# Altium footprint library ZLS_Lib.PcbLib: 25 footprints (part 2 of 2)
Each footprint in its own frame and in the unit in brackets; x right, y up, seen from the top. Pads: shape width x height; smd on the part's side, far side on the other; paste and mask are expansions set on the pad; w line width, h text height; cw(c..) or ccw(c..) is an arc to the next point about the centre after c.
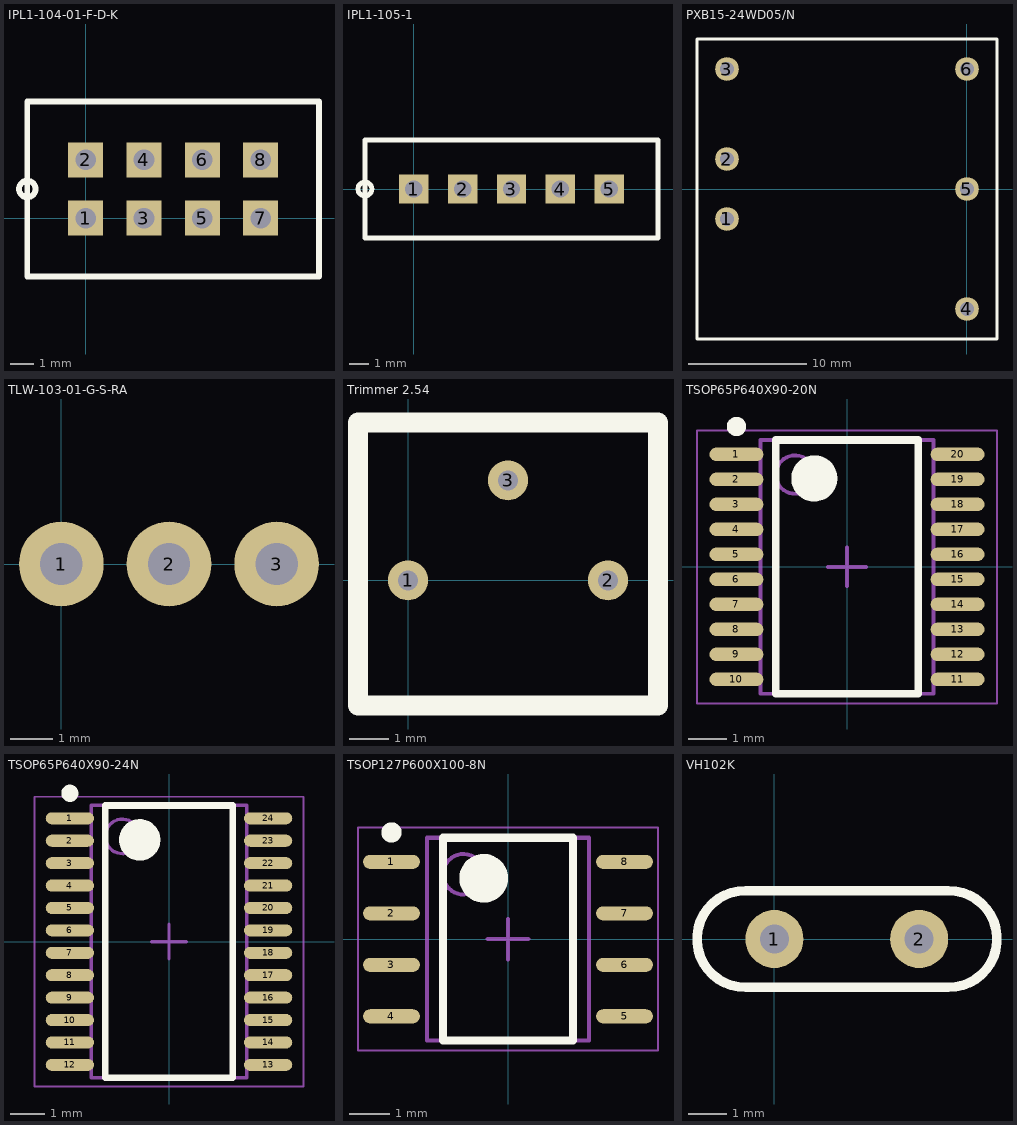
[diagram p1: the footprints below, top view; thin cyan lines are the x and y axes]

## IPL1-104-01-F-D-K [mil]
height 161
pads (8):
  rect 60x60 hole 35.43: 1(0,0) 2(0,100) 3(100,0) 4(100,100) 5(200,0) 6(200,100) 7(300,0) 8(300,100)
Top Overlay:
  circle w10: c-100,50 r14.14
  lines w10: -100,-100 400,-100 400,200 -100,200 -100,-100
3D body "_IPL1_104_01_D_header_2.sldprt": height 320, standoff 0, extent -80,-121 380,189

## IPL1-105-1 [mil]
height 344.88
pads (5):
  rect 60x60 hole 35.43: 1(0,0) 2(100,0) 3(200,0) 4(300,0) 5(400,0)
Top Overlay:
  circle w10: c-100,0 r14.14
  lines w10: -100,-100 -100,100 500,100 500,-100 -100,-100
3D body "_IPL1_105_01_S_header_2.sldprt": height 320, standoff 0, extent -81.18,-141.73 478.82,118.27

## PXB15-24WD05/N [mm] "DC-DC CONV 15W DUAL 5V"
height 9.9
pads (6):
  round 2 hole 1.2: 1(-20.32,-2.54) 2(-20.32,2.54) 3(-20.32,10.16) 4(0,-10.16) 5(0,0) 6(0,10.16)
Top Overlay:
  lines w0.254: -22.86,-12.7 -22.86,12.7 2.54,12.7 2.54,-12.7 -22.86,-12.7
3D body: height 9.9, standoff 0, extent -21.422,-11.262 1.102,11.262
3D body: height 9.9, standoff 0, extent -22.987,-12.827 2.667,12.827
3D body: height 9.9, standoff 0, extent -22.859,-12.699 2.539,12.699
3D body: height 9.9, standoff 0, extent -22.987,-12.827 2.667,12.827
3D body: height 9.9, standoff 0, extent -21.422,-11.262 1.102,11.262
3D body: height 9.9, standoff 0, extent -22.987,-12.827 2.667,12.827
3D body: height 9.9, standoff 0, extent -22.859,-12.699 2.539,12.699
3D body: height 9.9, standoff 0, extent -22.987,-12.827 2.667,12.827
3D body: height 9.9, standoff 0, extent -21.422,-11.262 1.102,11.262
3D body: height 9.9, standoff 0, extent -22.987,-12.827 2.667,12.827
3D body: height 9.9, standoff 0, extent -22.859,-12.699 2.539,12.699
3D body: height 9.9, standoff 0, extent -22.987,-12.827 2.667,12.827

## TLW-103-01-G-S-RA [mm]
height 1.52
pads (3):
  round 2 hole 1: 1(0,0) 2(2.54,0) 3(5.08,0)
3D body "_TLW_103_01_G_S_RA0_495_terminal_2.sldprt": height 1.52, standoff 0, extent -1.27,-1.245 6.35,1.245
3D body "_TLW_03_01_S_RA_4.sldprt": height 1.24, standoff -3.49, extent -0.381,-8.922 5.588,0.286

## Trimmer 2.54 [mil]
pads (3):
  round 40 hole 20: 1(0,0) 2(200,0) 3(100,100)
Top Overlay:
  lines w20: -50,-125 -50,157.6 -36.2,157.6 -20.6,157.6 39.4,157.6 250,157.6 250,-50 250,-125 -50,-125
3D body: height 175, standoff 0, extent -60,-125.98 260,167.6
3D body: height 175, standoff 0, extent -49.98,-122.05 249.98,157.58
3D body: height 175, standoff 0, extent -60,-119.09 260,167.6
3D body: height 175, standoff 0, extent -50.2,-125 248.03,157.6
3D body: height 175, standoff 100, extent -15.03,167.08 13.78,199.8

## TSOP65P640X90-20N [mm] "TSOP, 20-Leads, Body 6.50x4.40mm, Pitch 0.65mm, IPC Medium Density"
height 0.9
pads (20):
  oval 1.4x0.35 smd: 1(-2.875,2.925) 2(-2.875,2.275) 3(-2.875,1.625) 4(-2.875,0.975) 5(-2.875,0.325) 6(-2.875,-0.325) 7(-2.875,-0.975) 8(-2.875,-1.625) 9(-2.875,-2.275) 10(-2.875,-2.925) 11(2.875,-2.925) 12(2.875,-2.275) 13(2.875,-1.625) 14(2.875,-0.975) 15(2.875,-0.325) 16(2.875,0.325) 17(2.875,0.975) 18(2.875,1.625) 19(2.875,2.275) 20(2.875,2.925)
Top Overlay:
  circle w0.6: c-0.85,2.3 r0.3
  circle w0.25: c-2.875,3.65 r0.125
  lines w0.2: -1.85,-3.3 1.85,-3.3 1.85,3.3 -1.85,3.3 -1.85,-3.3
Mechanical 13:
  circle w0.1: c-1.35,2.4 r0.5
  lines w0.1: -2.25,-3.3 2.25,-3.3 2.25,3.3 -2.25,3.3 -2.25,-3.3
Mechanical 15:
  lines w0.05: -3.9,-3.55 3.9,-3.55 3.9,3.55 -3.9,3.55 -3.9,-3.55
  lines w0.1: -0.5,0 0.5,0 ; 0,-0.5 0,0.5
3D body: height 0.9, standoff 0.1, extent -2.25,-3.3 2.25,3.3

## TSOP65P640X90-24N [mm] "TSOP, 24-Leads, Body 7.80x4.40mm, Pitch 0.65mm, IPC Medium Density"
height 0.9
pads (24):
  oval 1.4x0.35 smd mask+0.076: 1(-2.875,3.575) 2(-2.875,2.925) 3(-2.875,2.275) 4(-2.875,1.625) 5(-2.875,0.975) 6(-2.875,0.325) 7(-2.875,-0.325) 8(-2.875,-0.975) 9(-2.875,-1.625) 10(-2.875,-2.275) 11(-2.875,-2.925) 12(-2.875,-3.575) 13(2.875,-3.575) 14(2.875,-2.925) 15(2.875,-2.275) 16(2.875,-1.625) 17(2.875,-0.975) 18(2.875,-0.325) 19(2.875,0.325) 20(2.875,0.975) 22(2.875,2.275) 23(2.875,2.925) 24(2.875,3.575)
  oval 1.4x0.35 smd mask+0.102: 21(2.875,1.625)
Top Overlay:
  circle w0.6: c-0.85,2.95 r0.3
  circle w0.25: c-2.875,4.3 r0.125
  lines w0.2: -1.85,-3.95 1.85,-3.95 1.85,3.95 -1.85,3.95 -1.85,-3.95
Mechanical 13:
  circle w0.1: c-1.35,3.05 r0.5
  lines w0.1: -2.25,-3.95 2.25,-3.95 2.25,3.95 -2.25,3.95 -2.25,-3.95
Mechanical 15:
  lines w0.05: -3.9,-4.2 3.9,-4.2 3.9,4.2 -3.9,4.2 -3.9,-4.2
  lines w0.1: -0.5,0 0.5,0 ; 0,-0.5 0,0.5
3D body "TSOP65P640X90-24N.step": height 0.9, standoff 0, extent -3.2,-3.95 3.2,3.95

## TSOP127P600X100-8N [mm] "TSOP, 8-Leads, Body 4.90x3.90mm, Pitch 1.27mm, IPC Medium Density"
height 1
pads (8):
  oval 1.4x0.35 smd: 1(-2.875,1.905) 2(-2.875,0.635) 3(-2.875,-0.635) 4(-2.875,-1.905) 5(2.875,-1.905) 6(2.875,-0.635) 7(2.875,0.635) 8(2.875,1.905)
Top Overlay:
  circle w0.25: c-2.875,2.63 r0.125
  circle w0.6: c-0.6,1.5 r0.3
  lines w0.2: -1.6,-2.5 -1.6,2.5 1.6,2.5 1.6,-2.5 -1.6,-2.5
Mechanical 13:
  circle w0.1: c-1.1,1.6 r0.5
  lines w0.1: -2,-2.5 -2,2.5 2,2.5 2,-2.5 -2,-2.5
Mechanical 15:
  lines w0.05: -3.7,-2.75 -3.7,2.75 3.7,2.75 3.7,-2.75 -3.7,-2.75
  lines w0.1: -0.5,0 0.5,0 ; 0,-0.5 0,0.5
3D body: height 1, standoff 0.1, extent -2,-2.5 2,2.5

## VH102K [mil] "Hermetically Sealed High Precision Resistor"
height 429.92
pads (2):
  round 60 hole 30: 1(0,0) 2(149.61,0)
Top Overlay:
  lines w10: -29.75,-50 cw(c-30,0) -29.75,50 179.75,50 cw(c180,0) 179.75,-50 -29.75,-50